# Altium footprint library Apalis Evaluation Board.PcbLib: 166 footprints (part 6 of 11)
Each footprint in its own frame and in the unit in brackets; x right, y up, seen from the top. Pads: shape width x height; smd on the part's side, far side on the other; paste and mask are expansions set on the pad; w line width, h text height; cw(c..) or ccw(c..) is an arc to the next point about the centre after c.
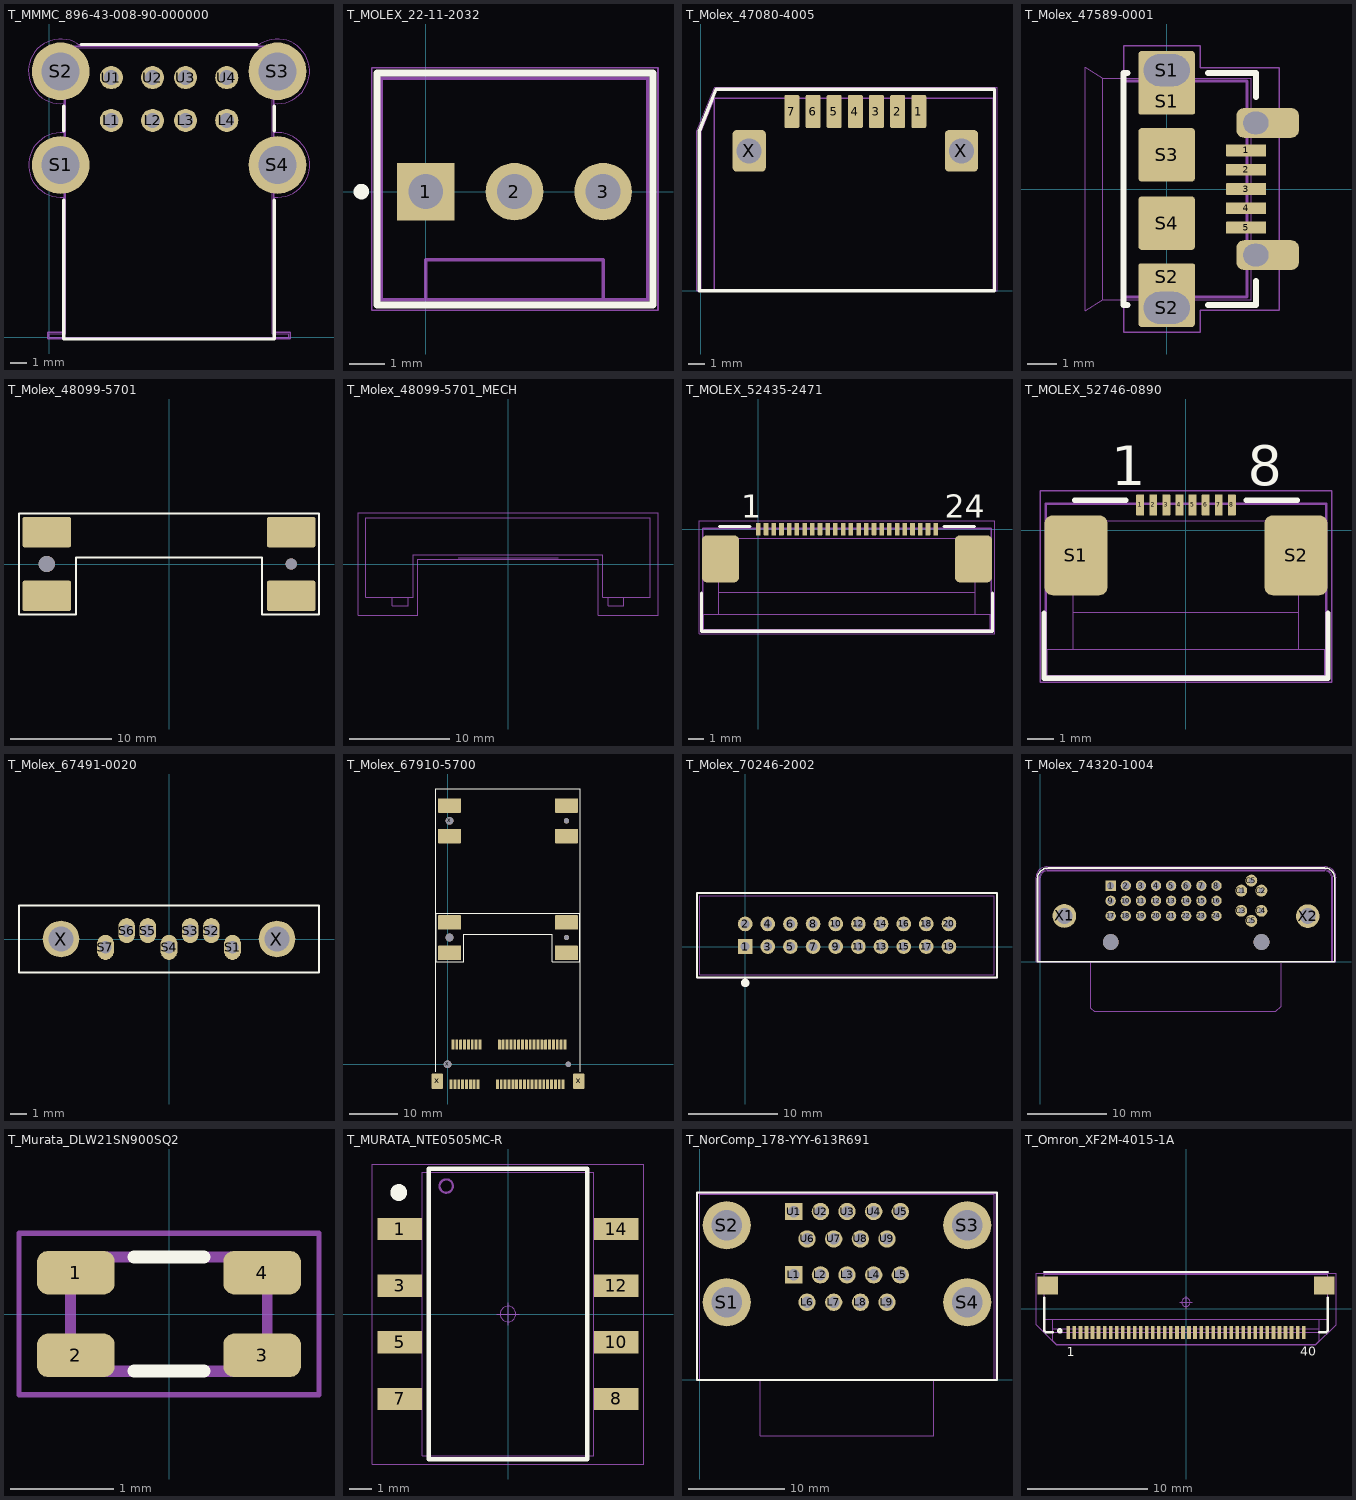
[diagram p5: the footprints below, top view; thin cyan lines are the x and y axes]

## T_MMMC_896-43-008-90-000000 [mm] "USB 2.0 double row, Type A"
height 15.6
pads (12):
  round 1.4 hole 0.9: L1(3.75,13.13) L2(6.25,13.13) L3(8.25,13.13) L4(10.75,13.13) U1(3.75,15.73) U2(6.25,15.73) U3(8.25,15.73) U4(10.75,15.73)
  round 3.5 hole 2.3: S1(0.68,10.43) S2(0.68,16.11) S3(13.82,16.11) S4(13.82,10.43)
Top Overlay:
  lines w0.2: 0.875,8.3 0.875,-0.12 13.625,-0.12 13.625,8.3 ; 0.875,12.5 0.875,14 ; 1.91,17.73 12.58,17.73 ; 13.625,12.5 13.625,14
Mechanical 1:
  lines w0.05: 0.901,8.484 0.901,0.299 -0.099,0.299 -0.099,-0.099 14.599,-0.099 14.599,0.299 13.599,0.299 13.599,8.485 ; 0.901,12.374 0.901,14.164 ; 0.902,8.484 cw(c0.685,10.429) 0.904,12.374 ; 0.903,14.164 cw(c0.679,16.109) 1.895,17.643 1.91,17.628 12.582,17.628 ; 12.582,17.631 cw(c13.815,16.11) 13.598,14.165 ; 13.599,12.375 13.599,14.165 ; 13.599,12.376 cw(c13.815,10.43) 13.6,8.485
Mechanical 2:
  lines w0.001: 0,0 0,0.2 1,0.2 1,17.53 13.5,17.53 13.5,0.2 14.5,0.2 14.5,0 0,0
Mechanical 3:
  lines w0.1: 0.9,0.299 0.9,17.629 13.599,17.629 13.599,0.299 14.6,0.299 14.6,-0.099 -0.099,-0.099 -0.099,0.299 0.901,0.299
3D body: height 16.17, standoff -3.58, extent -0.45,0 14.95,17.53

## T_MOLEX_22-11-2032 [mm] "Connector; Header; 3 Position with Friction Lock"
height 10
pads (3):
  rect 1.65x1.65 hole 1: 1(0,0)
  round 1.65 hole 1: 2(2.54,0) 3(5.08,0)
Top Overlay:
  circle w0.254: c-1.845,0 r0.095
  lines w0.2: -1.4,-3.25 6.5,-3.25 6.5,3.4 -1.4,3.4 -1.4,-3.25
Mechanical 1:
  lines w0.05: -1.55,-3.4 6.65,-3.4 6.65,3.55 -1.55,3.55 -1.55,-3.4
Mechanical 2:
  lines w0.001: -1.27,-3.099 6.35,-3.099 6.35,3.251 -1.27,3.251 -1.27,-3.099
Mechanical 3:
  lines w0.1: 0,-3.099 0,-1.955 5.08,-1.955 5.08,-3.099 ; -1.27,-3.099 6.35,-3.099 6.35,3.251 -1.27,3.251 -1.27,-3.099
3D body: height 10.68, standoff -3.54, extent -1.27,-3.099 6.35,3.251

## T_Molex_47080-4005 [mm] "SATA Connector SMD"
height 5.85
pads (9):
  rrect25% 0.9x2 smd: 1(13.08,10.76) 2(11.81,10.76) 3(10.54,10.76) 4(9.27,10.76) 5(8,10.76) 6(6.73,10.76) 7(5.46,10.76)
  rrect25% 2x2.5 hole 1.5: X(2.9,8.4) X(15.64,8.4)
Top Overlay:
  lines w0.2: -0.1,0 -0.1,9.585 0.903,12.095 17.625,12.095 17.625,0 -0.1,0
Mechanical 1:
  lines w0.05: -0.235,0 -0.235,9.576 0.819,12.215 17.775,12.215 17.775,0 -0.235,0
Mechanical 2:
  lines w0.001: 0.8,0 0.8,11.56 ; 0.8,11.56 0,9.56 0,0 17.54,0 17.54,11.56 0.8,11.56
Mechanical 3:
  lines w0.1: 0.8,0 0.8,11.56 ; 0.8,11.56 17.54,11.56 17.54,0 0,0 0,9.56 0.8,11.56
3D body: height 5.87, standoff -2.58, extent 0,0 17.54,11.56

## T_Molex_47589-0001 [mm] "Micro USB Connector"
height 2.5
pads (13):
  rrect12% 1.35x0.4 smd: 1(2.675,1.3) 2(2.675,0.65) 3(2.675,0) 4(2.675,-0.65) 5(2.675,-1.3)
  rrect12% 1.9x0.9 smd: S1(0,2.963) S2(0,-2.963)
  rrect12% 1.9x2.1 hole 1.07 slot 1.55 at 0 deg copper offset 0,-0.4: S1(0,4)
  rrect12% 1.9x2.1 hole 1.07 slot 1.55 at 0 deg copper offset 0,0.4: S2(0,-4)
  rrect12% 1.9x1.8 smd: S3(0,1.15) S4(0,-1.15)
  rrect50% 2.1x1 hole 0.75 slot 0.85 at 0 deg copper offset 0.4,0: ""(3,-2.225) ""(3,2.225)
Top Overlay:
  lines w0.2: -1.32,-3.91 -1.45,-3.91 -1.45,3.91 -1.32,3.91 ; 1.397,-3.91 3,-3.91 3,-3.099 ; 1.397,3.91 3,3.91 ; 3.01,3.099 3.01,3.91
Mechanical 1:
  lines w0.05: -1.45,-4.83 -1.45,4.83 1.13,4.83 1.13,4.08 3.79,4.08 3.79,-4.08 1.13,-4.08 1.13,-4.83 -1.45,-4.83
Mechanical 2:
  lines w0.001: -2.15,-3.725 2.85,-3.725 2.85,3.725 -2.15,3.725 ; -2.15,-3.725 -2.15,3.725 ; -2.15,-3.725 -2.75,-4.1 -2.75,4.1 -2.15,3.725
Mechanical 3:
  lines w0.1: -1.45,-3.64 2.7,-3.64 2.7,3.64 -1.45,3.64 -1.45,-3.64
3D body: height 2.79, standoff -0.58, extent -2.75,-4.325 3.149,4.325

## T_Molex_48099-5701 [mm] "Mini PCI-E Latch"
height 6.5
pads (6):
  rrect12% 4.8x3 smd: ""(-12.1,-3.15) ""(-12.1,3.15) ""(12.1,-3.15) ""(12.1,3.15)
  round 1.6 hole 1.6 unplated: ""(-12.1,0)
  round 1.1 hole 1.1 unplated: ""(12.1,0)
Top Overlay:
  lines w0.2: -14.85,-5 -14.85,5 14.85,5 14.85,-5 9.2,-5 9.2,0.65 -9.2,0.65 -9.2,-5 -14.85,-5

## T_Molex_48099-5701_MECH [mm] "Mini PCI-E Latch, 3D Model Only"
height 6.5
Mechanical 1:
  lines w0.05: -15,-5.15 -15,5.15 15,5.15 15,-5.15 9.05,-5.15 9.05,0.5 -9.05,0.5 -9.05,-5.15 -15,-5.15
Mechanical 2:
  lines w0.001: -11.6,-3.35 -11.6,-4.16 -10,-4.16 -10,-3.35 ; -5,0.6 5,0.6 ; 10,-3.35 10,-4.16 11.6,-4.16 11.6,-3.35 ; -14.225,-3.35 -9.5,-3.35 -9.5,0.93 9.5,0.93 9.5,-3.35 14.225,-3.35 14.225,4.6 -14.225,4.6 -14.225,-3.35
Mechanical 3:
  lines w0.1: -11.6,-3.35 -11.6,-4.16 -10,-4.16 -10,-3.35 ; 10,-3.35 10,-4.16 11.6,-4.16 11.6,-3.35 ; -14.225,-3.35 -9.5,-3.35 -9.5,0.93 9.5,0.93 9.5,-3.35 14.225,-3.35 14.225,4.6 -14.225,4.6 -14.225,-3.35
3D body: height 6.56, standoff -0.73, extent -14.221,-4.351 14.229,4.559

## T_MOLEX_52435-2471 [mm] "DVI FFC Connector 0.5mm pitch"
height 2
pads (26):
  rrect12% 0.3x0.8 smd: 1(0,0) 2(0.5,0) 3(1,0) 4(1.5,0) 5(2,0) 6(2.5,0) 7(3,0) 8(3.5,0) 9(4,0) 10(4.5,0) 11(5,0) 12(5.5,0) 13(6,0) 14(6.5,0) 15(7,0) 16(7.5,0) 17(8,0) 18(8.5,0) 19(9,0) 20(9.5,0) 21(10,0) 22(10.5,0) 23(11,0) 24(11.5,0)
  rrect25% 2.4x3.05 smd: ""(-2.45,-1.925) ""(13.95,-1.925)
Top Overlay:
  lines w0.2: -3.672,-4.125 -3.672,-6.62 15.175,-6.62 15.175,-4.125 ; -2.5,0.175 -0.55,0.175 ; 12.05,0.175 14,0.175
  text "1" at -1.1,0.75 h1.5
  text "24" at 12.1,0.75 h1.5
Mechanical 1:
  lines w0.05: -3.816,-6.766 15.316,-6.766 15.316,0.543 -3.816,0.543 -3.816,-6.766
Mechanical 2:
  lines w0.001: -2.55,-5.5 -2.55,-0.6 14.05,-0.6 14.05,-5.5 ; -2.55,-4.1 14.05,-4.1 ; -3.55,-6.5 -3.55,-5.5 15.05,-5.5 15.05,-6.5 -3.55,-6.5
Mechanical 3:
  lines w0.1: -3.61,-6.558 -3.61,0.044 15.109,0.044 15.109,-6.558 -3.61,-6.558

## T_MOLEX_52746-0890 [mm] "JTAG FFC Connector 0.5mm pitch"
height 2
pads (10):
  rrect12% 0.3x0.8 smd: 1(-1.75,0.962) 2(-1.25,0.962) 3(-0.75,0.962) 4(-0.25,0.962) 5(0.25,0.962) 6(0.75,0.962) 7(1.25,0.962) 8(1.75,0.962)
  rrect25% 2.4x3.05 smd: S1(-4.2,-0.962) S2(4.2,-0.962)
Top Overlay:
  lines w0.2: -5.422,-3.163 -5.422,-5.657 5.421,-5.657 5.421,-3.163 ; -4.25,1.137 -2.3,1.137 ; 2.3,1.137 4.25,1.137
  text "1" at -2.85,1.717 h1.5
  text "8" at 2.357,1.717 h1.5
Mechanical 1:
  lines w0.05: -5.566,-5.803 5.566,-5.803 5.566,1.506 -5.566,1.506 -5.566,-5.803
Mechanical 2:
  lines w0.001: -4.3,-4.537 -4.3,0.363 4.3,0.363 4.3,-4.537 ; -4.3,-3.137 4.3,-3.137 ; -5.3,-5.537 -5.3,-4.537 5.3,-4.537 5.3,-5.537 -5.3,-5.537
Mechanical 3:
  lines w0.1: -5.36,-5.595 -5.36,1.006 5.36,1.006 5.36,-5.595 -5.36,-5.595
3D body: height 2.02, standoff 0.02, extent -5.05,-5.037 5.05,1.363

## T_Molex_67491-0020 [mm] "SATA connector TH"
height 8.4
pads (9):
  oval 1x1.5 hole 0.74: S1(3.81,-0.5) S2(2.54,0.5) S3(1.27,0.5) S4(0,-0.5) S5(-1.27,0.5) S6(-2.54,0.5) S7(-3.81,-0.5)
  round 2.2 hole 1.5: X(-6.48,0) X(6.48,0)
Top Overlay:
  lines w0.127: -9,-2 -9,2 9,2 9,-2 -9,-2

## T_Molex_67910-5700 [mm] "Molex PCIe mini card connector with clip"
height 4
pads (68):
  rrect12% 0.6x2 smd: 1(0.7,-4.1) 2(1.1,4.1) 3(1.5,-4.1) 4(1.9,4.1) 5(2.3,-4.1) 6(2.7,4.1) 7(3.1,-4.1) 8(3.5,4.1) 9(3.9,-4.1) 10(4.3,4.1) 11(4.7,-4.1) 12(5.1,4.1) 13(5.5,-4.1) 14(5.9,4.1) 15(6.3,-4.1) 16(6.7,4.1) 17(10.3,-4.1) 18(10.7,4.1) 19(11.1,-4.1) 20(11.5,4.1) 21(11.9,-4.1) 22(12.3,4.1) 23(12.7,-4.1) 24(13.1,4.1) 25(13.5,-4.1) 26(13.9,4.1) 27(14.3,-4.1) 28(14.7,4.1) 29(15.1,-4.1) 30(15.5,4.1) 31(15.9,-4.1) 32(16.3,4.1) 33(16.7,-4.1) 34(17.1,4.1) 35(17.5,-4.1) 36(17.9,4.1) 37(18.3,-4.1) 38(18.7,4.1) 39(19.1,-4.1) 40(19.5,4.1) 41(19.9,-4.1) 42(20.3,4.1) 43(20.7,-4.1) 44(21.1,4.1) 45(21.5,-4.1) 46(21.9,4.1) 47(22.3,-4.1) 48(22.7,4.1) 49(23.1,-4.1) 50(23.5,4.1) 51(23.9,-4.1) 52(24.3,4.1)
  rrect12% 2.3x3.2 smd: x(-2.15,-3.5) x(27.15,-3.5)
  round 1.6 hole 1.6 unplated: x(0,0) x(0.4,50.4) ""(0.4,26.25)
  round 1.1 hole 1.1 unplated: x(24.6,50.4) x(25,0) ""(24.6,26.25)
  rrect12% 4.8x3 smd: ""(0.4,47.25) ""(0.4,53.55) ""(0.4,23.1) ""(0.4,29.4) ""(24.6,47.25) ""(24.6,53.55) ""(24.6,23.1) ""(24.6,29.4)
Top Overlay:
  lines w0.2: -2.51,57 27.49,57 ; -2.5,-1.5 -2.5,57 ; 27.5,-1.5 27.5,57 ; -2.35,21.25 -2.35,31.25 27.35,31.25 27.35,21.25 21.7,21.25 21.7,26.9 3.3,26.9 3.3,21.25 -2.35,21.25
3D body: height 5.77, standoff -0.73, extent -2.5,-5.1 27.5,5.1

## T_Molex_70246-2002 [mm] "Header shrouded, 2x10 Pins, 2.54 mm pitch"
height 8.51
pads (20):
  rect 1.65x1.65 hole 1: 1(0,0)
  round 1.65 hole 1: 2(0,2.54) 3(2.54,0) 4(2.54,2.54) 5(5.08,0) 6(5.08,2.54) 7(7.62,0) 8(7.62,2.54) 9(10.16,0) 10(10.16,2.54) 11(12.7,0) 12(12.7,2.54) 13(15.24,0) 14(15.24,2.54) 15(17.78,0) 16(17.78,2.54) 17(20.32,0) 18(20.32,2.54) 19(22.86,0) 20(22.86,2.54)
Top Overlay:
  circle w0.5: c0,-4.075 r0.224
  lines w0.2: -5.4,-3.475 28.25,-3.475 28.25,6 -5.4,6 -5.4,-3.475
Mechanical 1:
  lines w0.05: -5.4,-3.475 -5.4,6 28.25,6 28.25,-3.475 -5.4,-3.475
Mechanical 2:
  lines w0.01: -5.08,-3.175 -5.08,5.715 27.94,5.715 27.94,-3.175 -5.08,-3.175
Mechanical 3:
  lines w0.1: -5.08,-3.175 -5.08,5.715 27.94,5.715 27.94,-3.175 -5.08,-3.175
3D body: height 9.29, standoff -3.41, extent -5.08,-3.175 27.94,5.715

## T_Molex_74320-1004 [mm] "DVI-Connectors"
height 12.7
pads (34):
  rect 1.3x1.3 hole 0.9: 1(8.89,9.63)
  round 1.3 hole 0.9: 2(10.8,9.63) 3(12.71,9.63) 4(14.62,9.63) 5(16.53,9.63) 6(18.44,9.63) 7(20.35,9.63) 8(22.26,9.63) 9(8.89,7.72) 10(10.8,7.72) 11(12.71,7.72) 12(14.62,7.72) 13(16.53,7.72) 14(18.44,7.72) 15(20.35,7.72) 16(22.26,7.72) 17(8.89,5.81) 18(10.8,5.81) 19(12.71,5.81) 20(14.62,5.81) 21(16.53,5.81) 22(18.44,5.81) 23(20.35,5.81) 24(22.26,5.81)
  round 1.5 hole 0.7: C1(25.39,9.01) C2(27.94,9.01) C3(25.39,6.46) C4(27.94,6.46) C5(26.665,5.185) C5(26.665,10.285)
  round 3 hole 2: X1(3.04,5.81) X2(33.79,5.785)
  round 2 hole 2 unplated paste+0 mask+0: ""(8.89,2.51) ""(27.94,2.51)
Top Overlay:
  lines w0.2: 0.978,11.866 ccw(c0.978,10.532) -0.356,10.532 -0.356,0 37.181,0 37.181,10.626 ; 0.978,11.868 35.936,11.868 cw(c35.936,10.626) 37.178,10.626
Mechanical 1:
  lines w0.05: -0.545,10.627 cw(c0.873,10.627) 0.873,12.045 ; -0.544,10.631 -0.544,0 37.36,0 37.36,10.64 ; 0.863,12.045 35.96,12.045 ; 35.942,12.044 cw(c35.942,10.626) 37.36,10.626
Mechanical 2:
  lines w0.001: 0,10.67 0,0 36.83,0 ; 0.001,10.65 cw(c0.85,10.65) 0.85,11.499 ; 0.84,11.499 35.968,11.499 cw(c35.968,10.65) 36.816,10.65 ; 6.4,0 6.4,-5.829 6.821,-6.25 29.76,-6.25 30.43,-5.581 ; 30.43,-5.581 30.43,0 ; 36.818,0.052 36.818,10.68
Mechanical 3:
  lines w0.1: -0.122,10.635 cw(c0.874,10.635) 0.874,11.63 35.923,11.63 cw(c35.923,10.604) 36.949,10.604 36.949,0 -0.119,0 -0.119,10.626
3D body: height 10.22, standoff -2.93, extent -0.335,-6.25 37.165,11.55

## T_Murata_DLW21SN900SQ2 [mm] "Common Mode Choke"
height 1.2
pads (4):
  rrect50% 0.75x0.42 smd: 1(-0.9,0.4) 2(-0.9,-0.4) 3(0.9,-0.4) 4(0.9,0.4)
Top Overlay:
  lines w0.127: -0.34,-0.55 0.34,-0.55 ; -0.34,0.55 0.34,0.55
Mechanical 1:
  lines w0.05: -1.45,-0.78 1.45,-0.78 1.45,0.78 -1.45,0.78 -1.45,-0.78
Mechanical 2:
  lines w0.001: -1,-0.6 1,-0.6 1,0.6 -1,0.6 -1,-0.6
Mechanical 3:
  lines w0.1: -0.95,-0.55 0.95,-0.55 0.95,0.55 -0.95,0.55 -0.95,-0.55
3D body: height 1.2, standoff 0, extent -1,-0.6 1,0.6

## T_MURATA_NTE0505MC-R [mm] "Isolated DC/DC converter"
height 6.6
pads (8):
  rect 2x1 smd: 1(-4.85,3.81) 3(-4.85,1.27) 5(-4.85,-1.27) 7(-4.85,-3.81) 8(4.85,-3.81) 10(4.85,-1.27) 12(4.85,1.27) 14(4.85,3.81)
Top Overlay:
  circle w0.5: c-4.905,5.45 r0.125
  lines w0.2: -3.56,-6.51 3.56,-6.51 3.56,6.51 -3.56,6.51 -3.56,-6.51
Mechanical 1:
  circle w0.05: c0,0 r0.35
  lines w0.05: -0.5,0 0.5,0 ; 0,-0.5 0,0.5 ; -6.08,-6.73 6.08,-6.73 6.08,6.73 -6.08,6.73 -6.08,-6.73
Mechanical 2:
  lines w0.001: -3.85,-6.35 3.85,-6.35 3.85,6.35 -3.85,6.35 -3.85,-6.35
Mechanical 3:
  circle w0.1: c-2.77,5.74 r0.3
  lines w0.1: -3.56,-6.51 -3.56,6.51 3.56,6.51 3.56,-6.51 -3.56,-6.51
3D body: height 6.6, standoff 0, extent -3.85,-6.35 3.85,6.35

## T_NorComp_178-YYY-613R691 [mm] "0.750 Center Dual Port D-Sub - Male over Male"
height 31.75
pads (22):
  rect 1.8x1.8 hole 1.2: L1(9.754,10.922) U1(9.754,17.501)
  round 1.8 hole 1.2: L2(12.522,10.922) L3(15.291,10.922) L4(18.059,10.922) L5(20.828,10.922) L6(11.138,8.077) L7(13.906,8.077) L8(16.675,8.077) L9(19.444,8.077) U2(12.522,17.501) U3(15.291,17.501) U4(18.059,17.501) U5(20.828,17.501) U6(11.138,14.656) U7(13.906,14.656) U8(16.675,14.656) U9(19.444,14.656)
  round 5 hole 3.2: S1(2.794,8.077) S2(2.794,16.078) S3(27.788,16.078) S4(27.788,8.077)
Top Overlay:
  lines w0.2: -0.3,0 30.875,0 30.875,19.5 -0.3,19.5 -0.3,0
Mechanical 1:
  lines w0.05: -0.213,0 30.802,0 30.802,19.417 -0.213,19.417 -0.213,0
Mechanical 2:
  lines w0.001: -0.002,0 30.58,0 ; 0,0 0,19.31 30.582,19.31 30.582,0 ; 6.291,0 6.291,-5.791 24.291,-5.791 24.291,0
Mechanical 3:
  lines w0.1: -0.216,0 30.802,0 30.802,19.413 -0.216,19.413 -0.216,0
3D body: height 31.79, standoff -3.16, extent -0.114,-6.096 30.696,19.304

## T_Omron_XF2M-4015-1A [mm] "DVI FFC Connector 0.5mm pitch"
height 2
pads (42):
  rect 0.3x1.1 smd: 1(-9.75,-1.95) 2(-9.25,-1.95) 3(-8.75,-1.95) 4(-8.25,-1.95) 5(-7.75,-1.95) 6(-7.25,-1.95) 7(-6.75,-1.95) 8(-6.25,-1.95) 9(-5.75,-1.95) 10(-5.25,-1.95) 11(-4.75,-1.95) 12(-4.25,-1.95) 13(-3.75,-1.95) 14(-3.25,-1.95) 15(-2.75,-1.95) 16(-2.25,-1.95) 17(-1.75,-1.95) 18(-1.25,-1.95) 19(-0.75,-1.95) 20(-0.25,-1.95) 21(0.25,-1.95) 22(0.75,-1.95) 23(1.25,-1.95) 24(1.75,-1.95) 25(2.25,-1.95) 26(2.75,-1.95) 27(3.25,-1.95) 28(3.75,-1.95) 29(4.25,-1.95) 30(4.75,-1.95) 31(5.25,-1.95) 32(5.75,-1.95) 33(6.25,-1.95) 34(6.75,-1.95) 35(7.25,-1.95) 36(7.75,-1.95) 37(8.25,-1.95) 38(8.75,-1.95) 39(9.25,-1.95) 40(9.75,-1.95)
  rect 1.7x1.5 smd: ""(-11.45,1.95) ""(11.45,1.95)
Top Overlay:
  circle w0.2: c-10.459,-1.819 r0.125
  lines w0.2: -11.752,0.919 -11.752,-1.798 -11.6,-1.95 -11.05,-1.95 ; -11.752,3.057 11.75,3.057 ; 11.05,-1.95 11.6,-1.95 11.75,-1.8 11.75,0.917
  text "1" at -9.885,-3.908 h0.75
  text "40" at 9.46,-3.899 h0.75
Mechanical 1:
  circle w0.05: c0,0.55 r0.35
  lines w0.05: -0.5,0.55 0.5,0.55 ; 0,0.05 0,1.05 ; -12.436,-1.303 -12.436,2.95 12.436,2.95 12.436,-1.304 10.762,-2.978 -10.761,-2.978 -12.436,-1.303
Mechanical 2:
  lines w0.001: -11.75,-0.85 11.75,-0.85 ; -11.05,-1.95 -11.6,-1.95 -11.75,-1.8 -11.75,1.45 -12.05,1.45 -12.05,2.55 -11.75,2.55 -11.75,2.95 11.75,2.95 11.75,2.55 12.05,2.55 12.05,1.45 11.75,1.45 11.75,-1.8 11.6,-1.95 11.05,-1.95 ; -11.05,-1.65 11.05,-1.65 ; -11.05,-0.85 -11.05,-2.65 -10.75,-2.95 10.75,-2.95 11.05,-2.65 11.05,-0.85
Mechanical 3:
  lines w0.1: -11.752,-1.798 -11.752,2.884 11.75,2.884 11.75,-1.8 11.6,-1.95 -11.6,-1.95 -11.752,-1.798